# Altium footprint library 430 integreted.PcbLib: 281 footprints (part 13 of 18)
Each footprint in its own frame and in the unit in brackets; x right, y up, seen from the top. Pads: shape width x height; smd on the part's side, far side on the other; paste and mask are expansions set on the pad; w line width, h text height; cw(c..) or ccw(c..) is an arc to the next point about the centre after c.
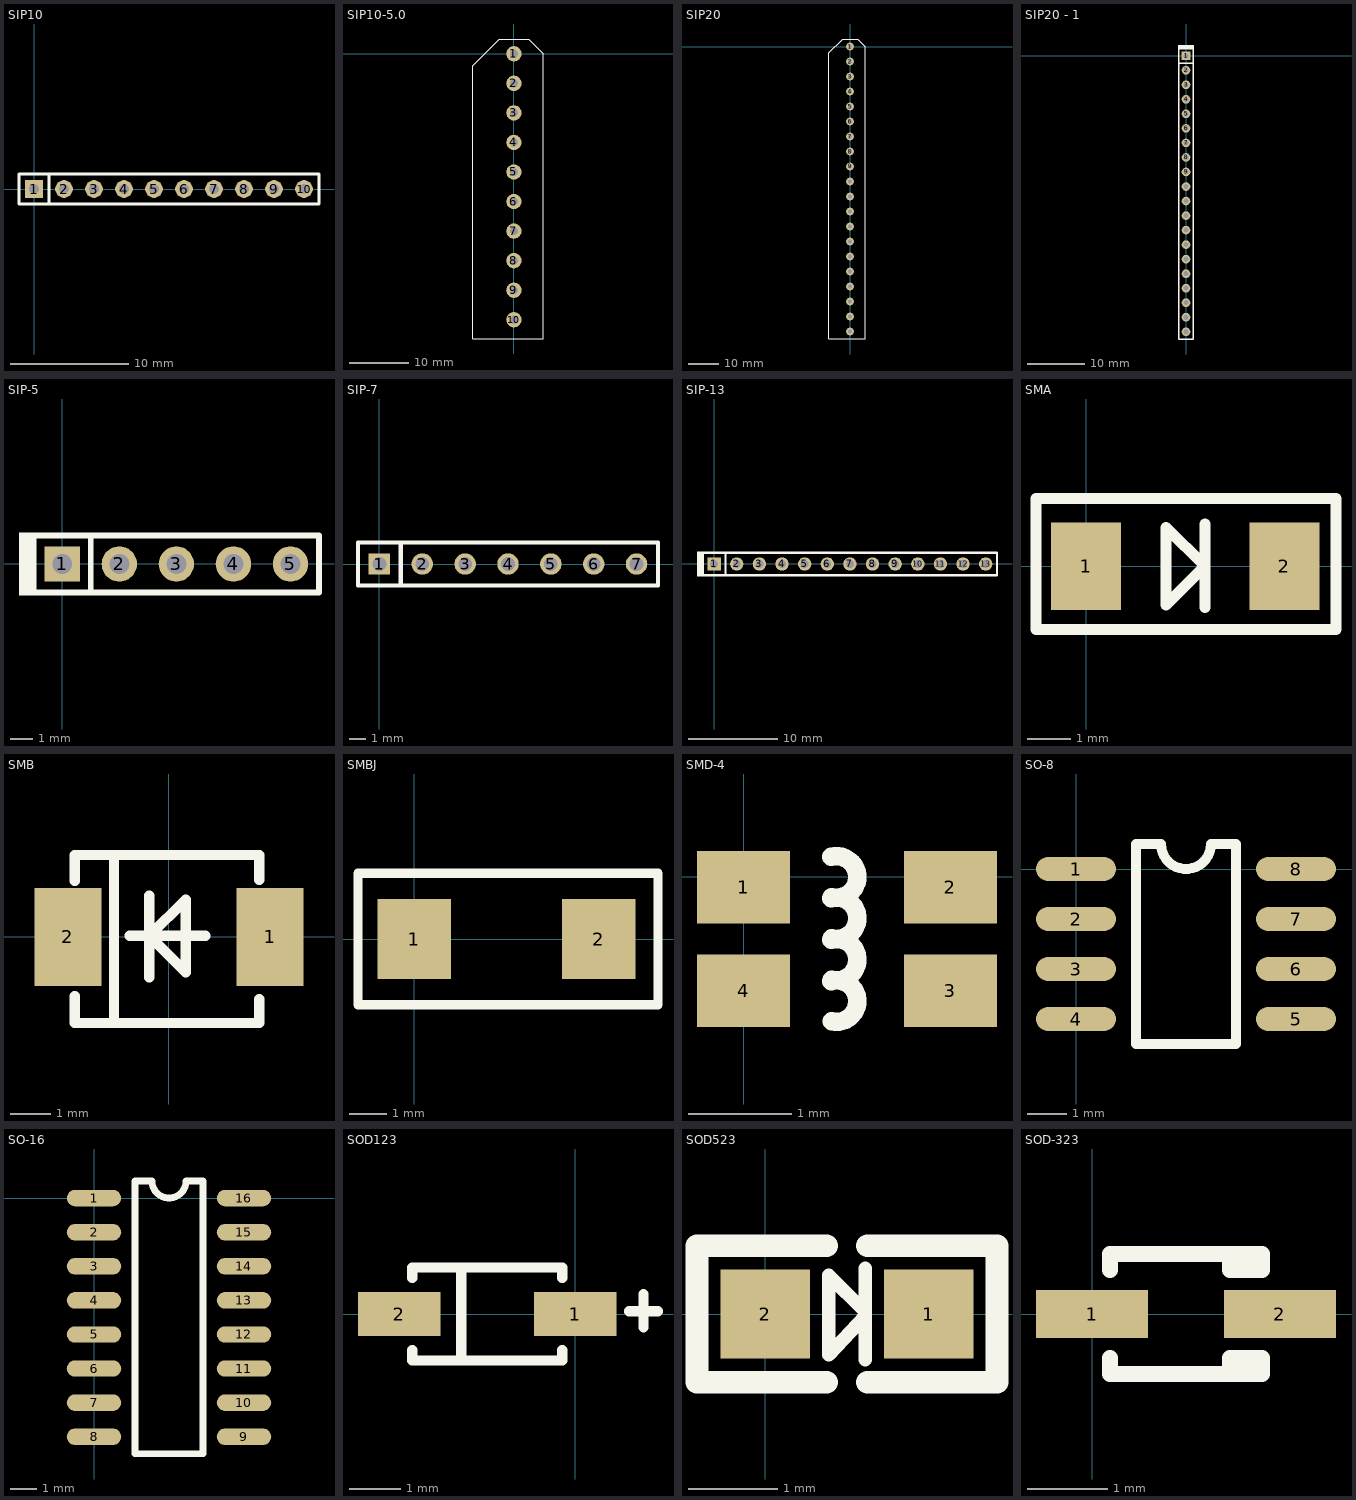
[diagram p12: the footprints below, top view; thin cyan lines are the x and y axes]

## SIP10 [mm]
pads (10):
  rect 1.5x1.5 hole 0.85: 1(0,0)
  round 1.5 hole 0.85: 2(2.54,0) 3(5.08,0) 4(7.62,0) 5(10.16,0) 6(12.7,0) 7(15.24,0) 8(17.78,0) 9(20.32,0) 10(22.86,0)
Top Overlay:
  lines w0.254: 1.27,-1.27 1.27,1.27 ; -1.27,-1.27 -1.27,1.27 24.13,1.27 24.13,-1.27 -1.27,-1.27

## SIP10-5.0 [mm]
pads (10):
  round 2.6 hole 1.397: 1(0,0) 2(0,-5) 3(0,-10) 4(0,-15) 5(0,-20) 6(0,-25) 7(0,-30) 8(0,-35) 9(0,-40) 10(0,-45)
Top Overlay:
  lines w0.203: -7,-48.26 -7,-2 -2.5,2.5 2.5,2.5 5,0 5,-48.26 -7,-48.26

## SIP20 [mm]
pads (20):
  round 2.6 hole 1.397: 1(0,0) 2(0,-5) 3(0,-10) 4(0,-15) 5(0,-20) 6(0,-25) 7(0,-30) 8(0,-35) 9(0,-40) 10(0,-45) 11(0,-50) 12(0,-55) 13(0,-60) 14(0,-65) 15(0,-70) 16(0,-75) 17(0,-80) 18(0,-85) 19(0,-90) 20(0,-95)
Top Overlay:
  lines w0.203: -7,-97.5 -7,-2 -2.5,2.5 2.5,2.5 5,0 5,-97.5 -7,-97.5

## SIP20 - 1 [mm]
pads (20):
  rect 1.5x1.5 hole 0.889: 1(0,0)
  round 1.5 hole 0.889: 2(0,-2.54) 3(0,-5.08) 4(0,-7.62) 5(0,-10.16) 6(0,-12.7) 7(0,-15.24) 8(0,-17.78) 9(0,-20.32) 10(0,-22.86) 11(0,-25.4) 12(0,-27.94) 13(0,-30.48) 14(0,-33.02) 15(0,-35.56) 16(0,-38.1) 17(0,-40.64) 18(0,-43.18) 19(0,-45.72) 20(0,-48.26)
Top Overlay:
  region: -1.4,1.925 -1.4,1.15 1.4,1.15 1.4,1.925
  lines w0.254: -1.27,-1.27 1.27,-1.27 ; 1.27,-24.13 1.27,-31.75 1.27,-49.53 -1.27,-49.53 -1.27,-31.75 -1.27,1.27 1.27,1.27 ; 1.27,-24.13 1.27,1.27 ; 1.27,-24.13 1.27,1.27 ; 1.27,-24.13 1.27,1.27

## SIP-5 [mil]
pads (5):
  rect 62x62 hole 35: 1(0,0)
  round 62 hole 35: 2(100,0) 3(200,0) 4(300,0) 5(400,0)
Top Overlay:
  rectangle: -75.79,-55.12 -45.28,55.12
  lines w10: 50,-50 50,50 ; -50,-50 450,-50 450,50 -50,50 -50,-50

## SIP-7 [mil]
pads (7):
  rect 50x50 hole 32: 1(0,0)
  round 50 hole 32: 2(100,0) 3(200,0) 4(300,0) 5(400,0) 6(500,0) 7(600,0)
Top Overlay:
  lines w10: 50,-50 50,50 ; -50,-50 -50,50 650,50 650,-50 -50,-50

## SIP-13 [mm]
pads (13):
  rect 1.5x1.5 hole 0.889: 1(0,0)
  round 1.5 hole 0.889: 2(2.54,0) 3(5.08,0) 4(7.62,0) 5(10.16,0) 6(12.7,0) 7(15.24,0) 8(17.78,0) 9(20.32,0) 10(22.86,0) 11(25.4,0) 12(27.94,0) 13(30.48,0)
Top Overlay:
  rectangle: -1.925,-1.4 -1.15,1.4
  lines w0.254: 1.27,-1.27 1.27,1.27 ; -1.27,1.27 24.13,1.27 ; -1.27,1.27 24.13,1.27 ; -1.27,1.27 24.13,1.27 ; -1.27,1.27 -1.27,-1.27 31.75,-1.27 31.75,1.27 24.13,1.27

## SMA [mm]
pads (2):
  rect 1.6x2 smd: 1(0,0) 2(4.535,0)
Top Overlay:
  lines w0.254: 2.718,-0.94 2.718,0.965 ; -1.143,-1.448 -1.143,1.549 5.715,1.549 5.715,-1.448 -1.143,-1.448 ; 1.829,-0.889 1.829,0.889 2.718,0 1.829,-0.889
3D body: height 2.4, standoff 0, extent 0.011,-1.325 4.611,1.375

## SMB [mm]
pads (2):
  rect 1.65x2.4 smd: 1(2.475,0) 2(-2.475,0)
Top Overlay:
  lines w0.254: -2.311,-1.448 -2.311,-2.108 2.21,-2.108 2.21,-1.524 ; -2.311,1.372 -2.311,2.007 2.21,2.007 2.21,1.397 ; -1.346,-2.032 -1.346,2.007 ; -0.965,0.025 0.889,0.025 ; -0.483,-0.991 -0.483,1.016 ; -0.483,0.025 0.406,0.914 0.406,-0.864 -0.483,0.025
3D body: height 2.45, standoff 0.03, extent -2.75,-1.975 2.75,1.925

## SMBJ [mm]
pads (2):
  rect 2x2.178 smd: 1(0,0)
  rect 2x2.159 smd: 2(5,0)
Top Overlay:
  lines w0.254: -1.524,-1.778 -1.524,1.778 6.604,1.778 6.604,-1.778 -1.524,-1.778
3D body: height 2.45, standoff 0.03, extent -0.159,-1.95 5.341,1.95

## SMD-4 [mm]
pads (4):
  rect 0.9x0.7 smd: 1(0,-0.1) 2(2,-0.1) 3(2,-1.1) 4(0,-1.1)
Top Overlay:
  lines w0.178: 0.849,-1.007 cw(c0.9,-1.2) 0.851,-1.394 ; 0.849,-0.607 cw(c0.9,-0.8) 0.851,-0.994 ; 0.849,-0.207 cw(c0.9,-0.4) 0.851,-0.594 ; 0.849,0.193 cw(c0.9,0) 0.851,-0.194

## SO-8 [mil]
pads (8):
  oval 80x24 smd: 1(0,0) 2(0,-50) 3(0,-100) 4(0,-150) 5(220,-150) 6(220,-100) 7(220,-50) 8(220,0)
Top Overlay:
  lines w10: 60,-175 160,-175 160,25 135,25 cw(c110,25) 85,25 60,25 60,-175
3D body: height 62.99, standoff 0, extent -7.7,-172.62 230.17,25.02

## SO-16 [mil]
pads (16):
  oval 80x24 smd: 1(0,0) 2(0,-50) 3(0,-100) 4(0,-150) 5(0,-200) 6(0,-250) 7(0,-300) 8(0,-350) 9(220,-350) 10(220,-300) 11(220,-250) 12(220,-200) 13(220,-150) 14(220,-100) 15(220,-50) 16(220,0)
Top Overlay:
  lines w10: 60,-375 60,25 85,25 ccw(c110,25) 135,25 160,25 160,-375 60,-375
3D body: height 57, standoff 0, extent -4.24,-371 228.25,22

## SOD123 [mm]
pads (2):
  rect 1.6x0.85 smd: 1(0,0) 2(-3.4,0)
Top Overlay:
  lines w0.2: -3.15,-0.7 -3.15,-0.9 -0.25,-0.9 -0.25,-0.7 ; -3.15,0.7 -3.15,0.9 -0.25,0.9 -0.25,0.7 ; -2.2,-0.9 -2.2,0.9 ; 1.043,0.051 1.602,0.051 ; 1.323,-0.254 1.323,0.381
3D body: height 1.42, standoff -0.03, extent -3.596,-0.853 0.254,0.847

## SOD523 [mm]
pads (2):
  rect 1x1 smd: 1(1.829,0) 2(0,0)
Top Overlay:
  lines w0.152: 1.118,-0.508 1.118,0.508 ; 1.118,-0.025 0.711,-0.457 0.711,0.432 1.118,0.025
  lines w0.254: 0.686,-0.762 -0.762,-0.762 -0.762,0.762 0.686,0.762 ; 1.143,-0.762 2.591,-0.762 2.591,0.762 1.143,0.762
3D body: height 0.65, standoff 0, extent 0.127,-0.381 1.727,0.419

## SOD-323 [mm]
pads (2):
  rect 1.4x0.6 smd: 1(0,0) 2(2.35,0)
Top Overlay:
  lines w0.2: 0.225,-0.55 0.225,-0.75 2.125,-0.75 2.125,-0.55 1.725,-0.55 1.725,-0.75 ; 0.225,0.55 0.225,0.75 2.125,0.75 2.125,0.55 1.725,0.55 1.725,0.75
3D body: height 1, standoff 0, extent -0.169,-0.667 2.431,0.633